# Altium footprint library PCBLIB.PcbLib: 775 footprints (part 8 of 49)
Each footprint in its own frame and in the unit in brackets; x right, y up, seen from the top. Pads: shape width x height; smd on the part's side, far side on the other; paste and mask are expansions set on the pad; w line width, h text height; cw(c..) or ccw(c..) is an arc to the next point about the centre after c.
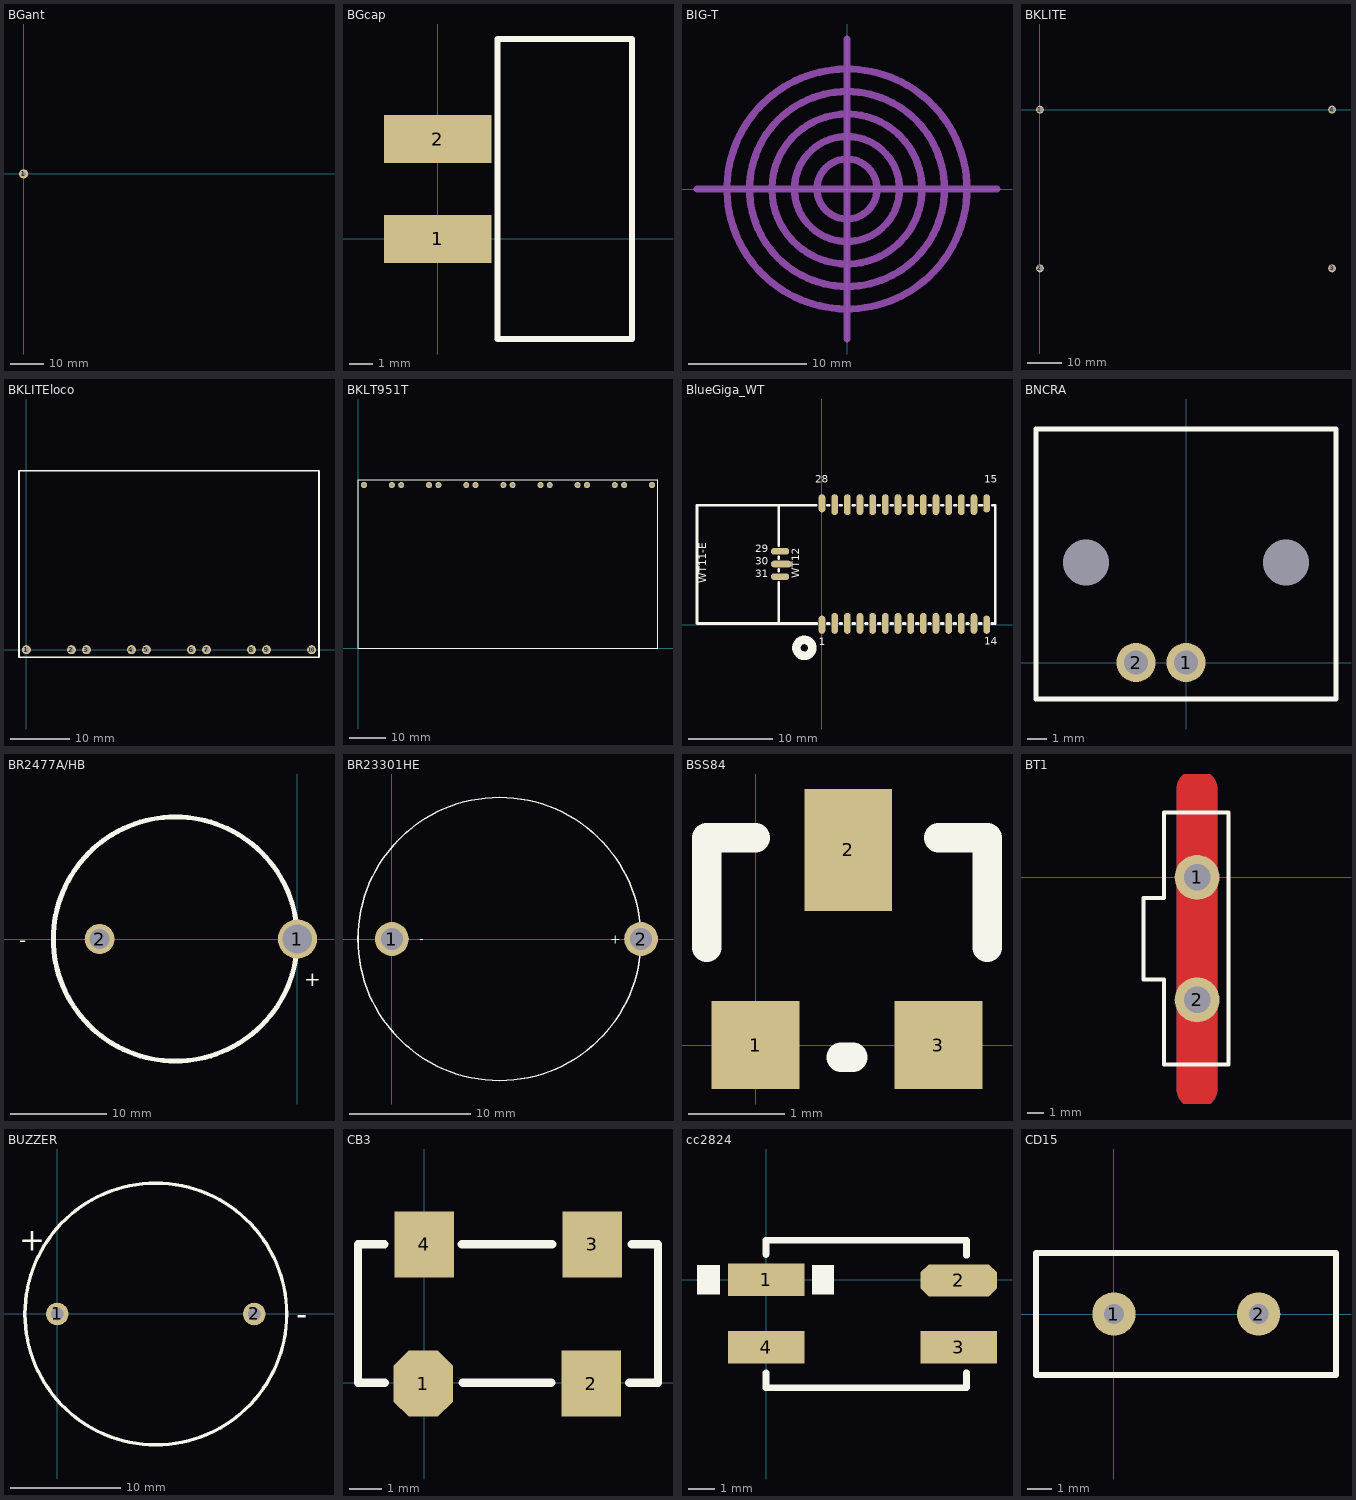
[diagram p7: the footprints below, top view; thin cyan lines are the x and y axes]

## BGant [mil]
pads (1):
  round 110 hole 60: 1(0,0)
BottomOverlay:
  lines w10: 0,-76.5 0,-413 3500,-413 3500,0 75,0
Mechanical4:
  text ".115" at 0,0 h1

## BGcap [mil]
pads (2):
  rect 180x80 smd: 1(0,0) 2(0,168)
TopOverlay:
  lines w10: 100,-168 100,336 326,336 326,-168 100,-168
Mechanical4:
  text ".280" at 0,0 h1

## BIG-T [mil]
Mechanical1:
  circle w24: c0,0 r400
  circle w24: c0,0 r325
  circle w24: c0,0 r250
  circle w24: c0,0 r175
  circle w24: c0,0 r100
  lines w24: -500,0 500,0 ; 0,-500 0,500

## BKLITE [mil]
pads (4):
  round 90 hole 65: 1(0,0) 2(0,-1820) 3(3350,-1820) 4(3350,0)
Mechanical4:
  text "0" at 0,0 h1

## BKLITEloco [mil]
pads (10):
  round 60 hole 35: 1(0,0) 2(300,0) 3(400,0) 4(700,0) 5(800,0) 6(1100,0) 7(1200,0) 8(1500,0) 9(1600,0) 10(1900,0)
TopOverlay:
  lines w10: -49.37,-49.37 -49.37,1191.1 1949.37,1191.1 1949.37,-49.37 -49.37,-49.37
Mechanical4:
  text ".120" at 0,0 h1

## BKLT951T [mil]
pads (16):
  round 65 hole 35: 1(3165,1755) 2(2865,1755) 3(2765,1755) 4(2465,1755) 5(2365,1755) 6(2065,1755) 7(1965,1755) 8(1665,1755) 9(1565,1755) 10(1265,1755) 11(1165,1755) 12(865,1755) 13(765,1755) 14(465,1755) 15(365,1755) 16(65,1755)
TopOverlay:
  lines w10: 0,0 3230,0 3230,1810 0,1810 0,0

## BlueGiga_WT [mm]
height 2.4
pads (31):
  rrect100% 0.8x2.159 smd: 1(0,0) 14(19.5,0) 15(19.5,14.369) 28(0,14.369)
  rrect100% 0.8x2.464 smd: 2(1.5,0.152) 3(3,0.152) 4(4.5,0.152) 5(6,0.152) 6(7.5,0.152) 7(9,0.152) 8(10.5,0.152) 9(12,0.152) 10(13.5,0.152) 11(15,0.152) 12(16.5,0.152) 13(18,0.152) 16(18,14.216) 17(16.5,14.216) 18(15,14.216) 19(13.5,14.216) 20(12,14.216) 21(10.5,14.216) 22(9,14.216) 23(7.5,14.216) 24(6,14.216) 25(4.5,14.216) 26(3,14.216) 27(1.5,14.216)
  rrect100% 2.159x0.8 smd: 29(-4.963,8.684) 31(-4.963,5.684)
  rrect100% 2.464x0.8 smd: 30(-4.81,7.184)
TopOverlay:
  circle w1.016: c-2.083,-2.743 r0.943
  lines w0.305: -5.1,0.137 -5.1,5.029 ; -5.1,6.35 -5.1,6.579 ; -5.1,7.798 -5.1,8.026 ; -5.1,9.347 -5.1,14.137 ; -0.66,14.137 -14.8,14.137 -14.8,0.137 -0.61,0.137 ; 0.635,0.137 0.864,0.137 ; 0.635,14.137 0.864,14.137 ; 2.134,0.137 2.362,0.137 ; 2.134,14.137 2.362,14.137 ; 3.632,0.137 3.861,0.137 ; 3.658,14.137 3.886,14.137 ; 5.131,14.137 5.359,14.137 ; 5.156,0.137 5.385,0.137 ; 6.629,14.137 6.858,14.137 ; 6.655,0.137 6.883,0.137 ; 8.128,0.137 8.357,0.137 ; 8.153,14.137 8.382,14.137 ; 9.627,0.137 9.855,0.137 ; 9.627,14.137 9.855,14.137 ; 11.1,14.137 11.328,14.137 ; 11.151,0.137 11.379,0.137 ; 12.624,0.137 12.852,0.137 ; 12.624,14.137 12.852,14.137 ; 14.122,14.137 14.351,14.137 ; 14.148,0.137 14.376,0.137 ; 15.621,0.137 15.85,0.137 ; 15.646,14.137 15.875,14.137 ; 17.12,0.137 17.348,0.137 ; 17.12,14.137 17.348,14.137 ; 18.618,0.137 18.847,0.137 ; 18.618,14.137 18.974,14.137 ; 20.117,0.137 20.5,0.137 20.5,14.137 20.142,14.137
  text "28" at -0.787,16.51 h1.52
  text "15" at 19.202,16.535 h1.52
  text "1" at -0.406,-2.718 h1.52
  text "14" at 19.202,-2.692 h1.52
  text "WT11-E" at -13.386,4.902 h1.52
  text "WT12" at -2.413,5.486 h1.52
  text "31" at -7.925,5.309 h1.52
  text "29" at -7.925,8.306 h1.52
  text "30" at -7.925,6.782 h1.52

## BNCRA [mil]
pads (4):
  round 78 hole 48: 1(0,0) 2(-100,0)
  round 0 hole 92 unplated: MH(-200,200) MH(200,200)
TopOverlay:
  lines w10: -300,-73 300,-73 300,467 -300,467 -300,-73
Mechanical4:
  text ".550" at -200,200 h1

## BR2477A/HB [mil]
pads (2):
  round 160 hole 120: 1(0,0)
  round 122 hole 82: 2(-807.09,0)
TopOverlay:
  circle w20: c-498,0 r498
  text "+" at 28,-192 h60
  text "-" at -1136,-31 h60

## BR23301HE [mil]
height 120
pads (2):
  round 110 hole 72: 1(0,0) 2(810,0)
TopOverlay:
  circle w5: c350,0 r460
  text "-" at 88.94,-14.09 h30
  text "+" at 710.16,-15.63 h30

## BSS84 [mil]
pads (3):
  rect 36x36 smd: 1(0,0) 3(75,0)
  rect 36x50 smd: 2(38,80)
TopOverlay:
  lines w12: -20,40 -20,85 0,85 ; 35,-5 40,-5 ; 75,85 95,85 95,40

## BT1 [mil]
pads (2):
  round 110 hole 65: 1(0,0) 2(0,-300)
TopLayer:
  lines w100: 0,-517.46 0,0 0,216.87
BottomLayer:
  lines w100: 0,-518.62 0,-300 0,216.47
TopOverlay:
  lines w10: 0,159 77,159 77,-459 -81,-459 -81,-250 -131,-250 -131,-50 -81,-50 -81,159 8,159
Mechanical4:
  text ".730" at 0,0 h1

## BUZZER [mil]
pads (2):
  round 80 hole 45: 1(0,0) 2(700,0)
TopOverlay:
  circle w12: c350,0 r465
  text "+" at -136,225 h80
  text "-" at 850,-40 h80
Mechanical4:
  text ".470" at 0,0 h1

## CB3 [mm]
height 1.524
pads (4):
  oct 1.8x2 smd: 1(-0.025,-0.025)
  rect 1.8x2 smd: 2(5.075,-0.025) 3(5.1,4.2) 4(0,4.2)
TopOverlay:
  lines w0.254: -1.203,4.2 -2.007,4.2 -2.007,0 -1.2,0 ; 1.143,4.2 3.886,4.2 ; 1.168,0 3.861,0 ; 6.223,0 7.1,0 7.1,4.2 6.308,4.2
  text "." at -1.854,-0.686 h1.27
Mechanical4:
  text ".100" at 0,0 h0.03

## cc2824 [mm]
pads (4):
  rect 2.86x1.2 smd: 1(0,0) 3(7.208,-2.525) 4(0,-2.525)
  oct 2.86x1.2 smd: 2(7.208,-0.025)
TopOverlay:
  rectangle: -2.586,-0.559 -1.733,0.56
  rectangle: 1.709,-0.546 2.534,0.559
  lines w0.254: 0,-3.48 0,-4.039 7.493,-4.039 7.493,-3.48 ; 0,0.94 0,1.473 7.493,1.473 7.493,0.914

## CD15 [mil]
height 330.71
pads (2):
  round 70 hole 32: 1(0,0) 2(234,0)
TopOverlay:
  lines w10: -125.98,-98.43 359,-98.43 359,98.43 -125.98,98.43 -125.98,-98.43